# Altium footprint library Connectors THD.PcbLib: 631 footprints (part 39 of 46)
Each footprint in its own frame and in the unit in brackets; x right, y up, seen from the top. Pads: shape width x height; smd on the part's side, far side on the other; paste and mask are expansions set on the pad; w line width, h text height; cw(c..) or ccw(c..) is an arc to the next point about the centre after c.
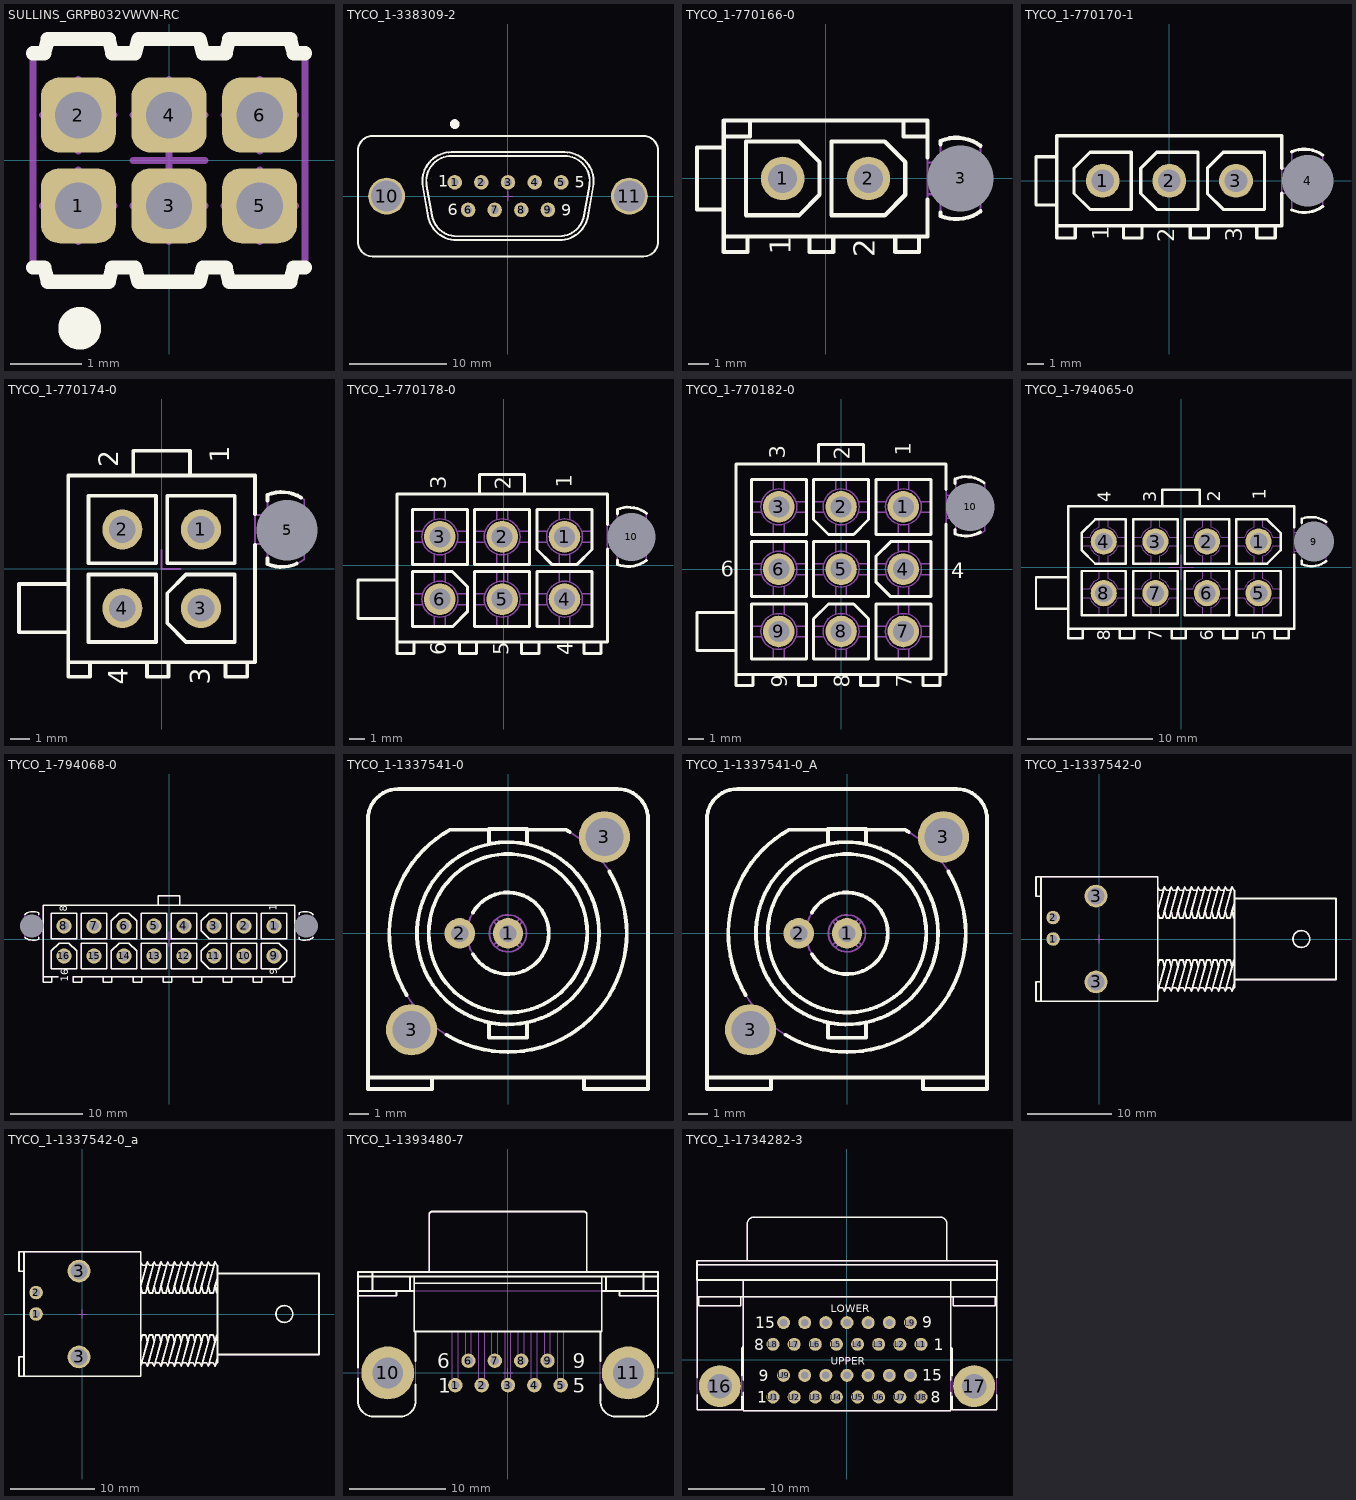
[diagram p38: the footprints below, top view; thin cyan lines are the x and y axes]

## SULLINS_GRPB032VWVN-RC [mm] "6 Contacts - Pitch 1.27mm - Dual Row Straight Strip Header - Insulator 1mm"
height 4
pads (6):
  rrect50% 1.05x1.05 hole 0.65: 1(-1.27,-0.635) 2(-1.27,0.635) 3(0,-0.635) 4(0,0.635) 5(1.27,-0.635) 6(1.27,0.635)
Top Overlay:
  circle w0.3: c-1.25,-2.35 r0.15
  lines w0.2: -1.905,-1.5 -1.746,-1.5 -1.696,-1.7 -0.844,-1.7 -0.794,-1.5 -0.476,-1.5 -0.426,-1.7 0.426,-1.7 0.476,-1.5 0.794,-1.5 0.844,-1.7 1.696,-1.7 1.746,-1.5 1.905,-1.5 ; -1.905,1.5 -1.746,1.5 -1.696,1.7 -0.844,1.7 -0.794,1.5 -0.476,1.5 -0.426,1.7 0.426,1.7 0.476,1.5 0.794,1.5 0.844,1.7 1.696,1.7 1.746,1.5 1.905,1.5
Mechanical 8:
  lines w0.1: -1.77,-0.635 -1.27,-0.635 ; -1.77,0.635 -1.27,0.635 ; -1.27,-1.135 -1.27,-0.635 ; -1.27,-0.135 -1.27,-0.635 ; -1.27,0.135 -1.27,0.635 ; -1.27,1.135 -1.27,0.635 ; -0.77,-0.635 -1.27,-0.635 ; -0.77,0.635 -1.27,0.635 ; -0.5,-0.635 0,-0.635 ; -0.5,0 0,0 ; -0.5,0.635 0,0.635 ; 0,-1.135 0,-0.635 ; 0,-0.5 0,0 ; 0,0.5 0,0 ; 0,1.135 0,0.635 ; 0.5,-0.635 0,-0.635 ; 0.5,0 0,0 ; 0.5,0.635 0,0.635 ; 0.77,-0.635 1.27,-0.635 ; 0.77,0.635 1.27,0.635 ; 1.27,-1.135 1.27,-0.635 ; 1.27,-0.135 1.27,-0.635 ; 1.27,0.135 1.27,0.635 ; 1.27,1.135 1.27,0.635 ; 1.77,-0.635 1.27,-0.635 ; 1.77,0.635 1.27,0.635
Mechanical 14:
  lines w0.1: -1.47,-0.835 -1.37,-0.735 ; -1.47,-0.835 -1.07,-0.835 ; -1.47,-0.835 -1.47,-0.435 ; -1.47,-0.435 -1.37,-0.535 ; -1.47,-0.435 -1.07,-0.435 ; -1.47,0.435 -1.37,0.535 ; -1.47,0.435 -1.07,0.435 ; -1.47,0.435 -1.47,0.835 ; -1.47,0.835 -1.37,0.735 ; -1.47,0.835 -1.07,0.835 ; -1.37,-0.735 -1.37,-0.535 ; -1.37,-0.735 -1.17,-0.735 ; -1.37,-0.535 -1.17,-0.535 ; -1.37,0.535 -1.37,0.735 ; -1.37,0.535 -1.17,0.535 ; -1.37,0.735 -1.17,0.735 ; -1.17,-0.735 -1.07,-0.835 ; -1.17,-0.735 -1.17,-0.535 ; -1.17,-0.535 -1.07,-0.435 ; -1.17,0.535 -1.07,0.435 ; -1.17,0.535 -1.17,0.735 ; -1.17,0.735 -1.07,0.835 ; -1.07,-0.835 -1.07,-0.435 ; -1.07,0.435 -1.07,0.835 ; -0.2,-0.835 -0.1,-0.735 ; -0.2,-0.835 0.2,-0.835 ; -0.2,-0.835 -0.2,-0.435 ; -0.2,-0.435 -0.1,-0.535 ; -0.2,-0.435 0.2,-0.435 ; -0.2,0.435 -0.1,0.535 ; -0.2,0.435 0.2,0.435 ; -0.2,0.435 -0.2,0.835 ; -0.2,0.835 -0.1,0.735 ; -0.2,0.835 0.2,0.835 ; -0.1,-0.735 -0.1,-0.535 ; -0.1,-0.735 0.1,-0.735 ; -0.1,-0.535 0.1,-0.535 ; -0.1,0.535 -0.1,0.735 ; -0.1,0.535 0.1,0.535 ; -0.1,0.735 0.1,0.735 ; 0.1,-0.735 0.2,-0.835 ; 0.1,-0.735 0.1,-0.535 ; 0.1,-0.535 0.2,-0.435 ; 0.1,0.535 0.2,0.435 ; 0.1,0.535 0.1,0.735 ; 0.1,0.735 0.2,0.835 ; 0.2,-0.835 0.2,-0.435 ; 0.2,0.435 0.2,0.835 ; 1.07,-0.835 1.17,-0.735 ; 1.07,-0.835 1.47,-0.835 ; 1.07,-0.835 1.07,-0.435 ; 1.07,-0.435 1.17,-0.535 ; 1.07,-0.435 1.47,-0.435 ; 1.07,0.435 1.17,0.535 ; 1.07,0.435 1.47,0.435 ; 1.07,0.435 1.07,0.835 ; 1.07,0.835 1.17,0.735 ; 1.07,0.835 1.47,0.835 ; 1.17,-0.735 1.17,-0.535 ; 1.17,-0.735 1.37,-0.735 ; 1.17,-0.535 1.37,-0.535 ; 1.17,0.535 1.17,0.735 ; 1.17,0.535 1.37,0.535 ; 1.17,0.735 1.37,0.735 ; 1.37,-0.735 1.47,-0.835 ; 1.37,-0.735 1.37,-0.535 ; 1.37,-0.535 1.47,-0.435 ; 1.37,0.535 1.47,0.435 ; 1.37,0.535 1.37,0.735 ; 1.37,0.735 1.47,0.835 ; 1.47,-0.835 1.47,-0.435 ; 1.47,0.435 1.47,0.835 ; -1.905,-1.5 -1.905,1.5 -1.746,1.5 -1.696,1.7 -0.844,1.7 -0.794,1.5 -0.476,1.5 -0.426,1.7 0.426,1.7 0.476,1.5 0.794,1.5 0.844,1.7 1.696,1.7 1.746,1.5 1.905,1.5 1.905,-1.5 1.746,-1.5 1.696,-1.7 0.844,-1.7 0.794,-1.5 0.476,-1.5 0.426,-1.7 -0.426,-1.7 -0.476,-1.5 -0.794,-1.5 -0.844,-1.7 -1.696,-1.7 -1.746,-1.5 -1.905,-1.5
3D body: height 4, standoff -2.3, extent -1.905,-1.7 1.905,1.7

## TYCO_1-338309-2 [mm] "Straight D-SUB 9 Male Contacts Connector with Harpoons and Female Screwlock (UNC4-40)"
height 11.7
pads (11):
  round 1.5 hole 0.8: 1(-5.486,1.423) 2(-2.743,1.423) 3(0,1.423) 4(2.743,1.423) 5(5.486,1.423) 6(-4.114,-1.423) 7(-1.371,-1.423) 8(1.372,-1.423) 9(4.115,-1.423)
  round 3.8 hole 3.2: 10(-12.495,0) 11(12.495,0)
Top Overlay:
  circle w0.5: c-5.48,7.42 r0.25
  lines w0.2: -15.445,-4.7 ccw(c-13.945,-4.7) -13.945,-6.2 13.945,-6.2 ccw(c13.945,-4.7) 15.445,-4.7 15.445,4.7 ccw(c13.945,4.7) 13.945,6.2 -13.945,6.2 ccw(c-13.945,4.7) -15.445,4.7 -15.445,-4.7 ; -8.775,1.021 cw(c-5.83,1.54) -5.83,4.53 5.83,4.53 cw(c5.83,1.54) 8.775,1.021 8.232,-2.059 cw(c5.287,-1.54) 5.287,-4.53 -5.287,-4.53 cw(c-5.287,-1.54) -8.231,-2.059 -8.775,1.021 ; -8.381,1.09 cw(c-5.83,1.54) -5.83,4.13 5.83,4.13 cw(c5.83,1.54) 8.381,1.09 7.838,-1.99 cw(c5.287,-1.54) 5.287,-4.13 -5.287,-4.13 cw(c-5.287,-1.54) -7.838,-1.99 -8.381,1.09
  text "6" at -6.21,-1.97 h1.2
  text "5" at 6.855,0.87 h1.2
  text "1" at -7.18,0.945 h1.2
  text "9" at 5.485,-2.02 h1.2
Mechanical 8:
  lines w0.1: -12.995,0 -12.495,0 ; -12.495,-0.5 -12.495,0 ; -12.495,0.5 -12.495,0 ; -11.995,0 -12.495,0 ; -5.986,1.423 -5.486,1.423 ; -5.486,0.923 -5.486,1.423 ; -5.486,1.923 -5.486,1.423 ; -4.986,1.423 -5.486,1.423 ; -4.614,-1.423 -4.114,-1.423 ; -4.114,-1.923 -4.114,-1.423 ; -4.114,-0.923 -4.114,-1.423 ; -3.614,-1.423 -4.114,-1.423 ; -3.243,1.423 -2.743,1.423 ; -2.743,0.923 -2.743,1.423 ; -2.743,1.923 -2.743,1.423 ; -2.243,1.423 -2.743,1.423 ; -1.871,-1.423 -1.371,-1.423 ; -1.371,-1.923 -1.371,-1.423 ; -1.371,-0.923 -1.371,-1.423 ; -0.871,-1.423 -1.371,-1.423 ; -0.5,0 0,0 ; -0.5,1.423 0,1.423 ; 0,-0.5 0,0 ; 0,0.5 0,0 ; 0,0.923 0,1.423 ; 0,1.923 0,1.423 ; 0.5,0 0,0 ; 0.5,1.423 0,1.423 ; 0.872,-1.423 1.372,-1.423 ; 1.372,-1.923 1.372,-1.423 ; 1.372,-0.923 1.372,-1.423 ; 1.872,-1.423 1.372,-1.423 ; 2.243,1.423 2.743,1.423 ; 2.743,0.923 2.743,1.423 ; 2.743,1.923 2.743,1.423 ; 3.243,1.423 2.743,1.423 ; 3.615,-1.423 4.115,-1.423 ; 4.115,-1.923 4.115,-1.423 ; 4.115,-0.923 4.115,-1.423 ; 4.615,-1.423 4.115,-1.423 ; 4.986,1.423 5.486,1.423 ; 5.486,0.923 5.486,1.423 ; 5.486,1.923 5.486,1.423 ; 5.986,1.423 5.486,1.423 ; 11.995,0 12.495,0 ; 12.495,-0.5 12.495,0 ; 12.495,0.5 12.495,0 ; 12.995,0 12.495,0
Mechanical 14:
  circle w0.1: c-4.114,-1.423 r0.51
  circle w0.1: c-1.371,-1.423 r0.51
  circle w0.1: c1.372,-1.423 r0.51
  circle w0.1: c4.115,-1.423 r0.51
  circle w0.1: c5.486,1.423 r0.51
  circle w0.1: c2.743,1.423 r0.51
  circle w0.1: c0,1.423 r0.51
  circle w0.1: c-2.743,1.423 r0.51
  circle w0.1: c-5.486,1.423 r0.51
  circle w0.1: c12.495,0 r1.422
  circle w0.1: c-12.495,0 r1.422
  lines w0.1: -15.445,-4.7 ccw(c-13.945,-4.7) -13.945,-6.2 13.945,-6.2 ccw(c13.945,-4.7) 15.445,-4.7 15.445,4.7 ccw(c13.945,4.7) 13.945,6.2 -13.945,6.2 ccw(c-13.945,4.7) -15.445,4.7 -15.445,-4.7 ; -8.775,1.021 cw(c-5.83,1.54) -5.83,4.53 5.83,4.53 cw(c5.83,1.54) 8.775,1.021 8.232,-2.059 cw(c5.287,-1.54) 5.287,-4.53 -5.287,-4.53 cw(c-5.287,-1.54) -8.231,-2.059 -8.775,1.021 ; -8.381,1.09 cw(c-5.83,1.54) -5.83,4.13 5.83,4.13 cw(c5.83,1.54) 8.381,1.09 7.838,-1.99 cw(c5.287,-1.54) 5.287,-4.13 -5.287,-4.13 cw(c-5.287,-1.54) -7.838,-1.99 -8.381,1.09
  text "9" at 5.485,-2.02 h1.2
  text "1" at -7.18,0.945 h1.2
  text "5" at 6.855,0.87 h1.2
  text "6" at -6.21,-1.97 h1.2
  text "9 D-Sub Male" at -6.053,4.872 h1.2
3D body: height 11.95, standoff -3.2, extent -15.445,-6.2 15.445,6.2

## TYCO_1-770166-0 [mm] "2 Circuits In-Line - Mini-Universal MATE-N-LOK Connector"
height 14.25
pads (3):
  round 2.1 hole 1.4: 1(-2.07,0) 2(2.07,0)
  round 1 hole 3.2 unplated mask+1.2: 3(6.52,0)
Top Overlay:
  lines w0.2: -4.915,-1.499 -6.21,-1.499 -6.21,1.499 -4.915,1.499 ; -4.915,2.032 -3.645,2.032 -3.645,2.794 ; -3.772,-2.794 -3.772,-3.556 -4.915,-3.556 -4.915,-2.794 ; -0.775,-2.794 -0.775,-3.556 0.368,-3.556 0.368,-2.794 ; 3.366,-2.794 3.366,-3.556 4.509,-3.556 4.509,-2.794 ; 3.772,2.794 3.772,2.032 4.915,2.032 ; 4.915,-1.016 4.915,-2.794 -4.915,-2.794 ; 4.915,1.016 4.915,2.794 -4.915,2.794 -4.915,-2.794 ; 5.55,-1.651 5.55,-1.815 ccw(c6.312,0) 7.48,-1.584 ; 5.55,1.651 5.55,1.815 cw(c6.312,0) 7.48,1.584 ; -3.848,-1.778 -3.848,1.778 -1.283,1.778 -0.292,0.787 -0.292,-0.787 -1.283,-1.778 -3.848,-1.778 ; 0.292,-1.778 0.292,1.778 2.858,1.778 3.848,0.787 3.848,-0.787 2.858,-1.778 0.292,-1.778
  text "1" at -1.689,-3.683 h1.02
  text "2" at 2.375,-3.81 h1.02
Mechanical 14:
  lines w0.1: -4.915,-1.499 -6.21,-1.499 -6.21,1.499 -4.915,1.499 ; -4.915,2.032 -3.645,2.032 -3.645,2.794 ; -3.772,-2.794 -3.772,-3.556 -4.915,-3.556 -4.915,-2.794 ; -0.775,-2.794 -0.775,-3.556 0.368,-3.556 0.368,-2.794 ; 3.366,-2.794 3.366,-3.556 4.509,-3.556 4.509,-2.794 ; 3.772,2.794 3.772,2.032 4.915,2.032 ; 4.915,-0.762 5.55,-0.762 5.55,-1.815 ccw(c6.312,0) 7.48,-1.584 7.48,1.584 ccw(c6.312,0) 5.55,1.815 5.55,0.762 4.915,0.762 ; -4.915,-2.794 -4.915,2.794 4.915,2.794 4.915,-2.794 -4.915,-2.794 ; -3.848,-1.778 -3.848,1.778 -1.283,1.778 -0.292,0.787 -0.292,-0.787 -1.283,-1.778 -3.848,-1.778 ; 0.292,-1.778 0.292,1.778 2.858,1.778 3.848,0.787 3.848,-0.787 2.858,-1.778 0.292,-1.778
  text "1" at -1.689,-3.683 h1.02
  text "2" at 2.375,-3.81 h1.02
3D body: height 14.25, standoff -4.32, extent -6.21,-3.556 7.481,2.794

## TYCO_1-770170-1 [mm] "3 Circuits In-Line - Mini-Universal MATE-N-LOK Connector"
height 14.25
pads (4):
  round 2.1 hole 1.4: 1(-4.14,0) 2(0,0) 3(4.14,0)
  round 1 hole 3.2 unplated mask+1.2: 4(8.59,0)
Top Overlay:
  lines w0.2: -6.985,-2.794 6.985,-2.794 6.985,-0.773 ; -6.985,-1.499 -8.28,-1.499 -8.28,1.499 -6.985,1.499 ; -5.842,-2.794 -5.842,-3.556 -6.985,-3.556 -6.985,2.794 6.985,2.794 6.985,0.773 ; -2.845,-2.794 -2.845,-3.556 -1.702,-3.556 -1.702,-2.794 ; 1.295,-2.794 1.295,-3.556 2.438,-3.556 2.438,-2.794 ; 5.436,-2.794 5.436,-3.556 6.579,-3.556 6.579,-2.794 ; 7.595,-1.804 ccw(c8.382,0) 9.525,-1.603 ; 7.595,1.804 cw(c8.382,0) 9.525,1.603 ; -5.918,-0.787 -5.918,0.787 -4.928,1.778 -2.362,1.778 -2.362,-1.778 -4.928,-1.778 -5.918,-0.787 ; -1.778,-0.787 -1.778,0.787 -0.787,1.778 1.778,1.778 1.778,-1.778 -0.787,-1.778 -1.778,-0.787 ; 2.362,-0.787 3.353,-1.778 5.918,-1.778 5.918,1.778 3.353,1.778 2.362,0.787 2.362,-0.787
  text "3" at 4.521,-3.783 h1.02
  text "1" at -3.759,-3.683 h1.02
  text "2" at 0.305,-3.81 h1.02
Mechanical 8:
  lines w0.1: -4.64,0 -4.14,0 ; -4.14,-0.5 -4.14,0 ; -4.14,0.5 -4.14,0 ; -3.64,0 -4.14,0 ; -0.5,0 0,0 ; 0,-0.5 0,0 ; 0,0.5 0,0 ; 0.5,0 0,0 ; 3.64,0 4.14,0 ; 4.14,-0.5 4.14,0 ; 4.14,0.5 4.14,0 ; 4.64,0 4.14,0 ; 8.09,0 8.59,0 ; 8.59,-0.5 8.59,0 ; 8.59,0.5 8.59,0 ; 9.09,0 8.59,0
Mechanical 14:
  circle w0.1: c4.14,0 r0.5
  circle w0.1: c0,0 r0.5
  circle w0.1: c-4.14,0 r0.5
  lines w0.1: -6.985,-2.794 6.985,-2.794 6.985,2.794 -6.985,2.794 -6.985,-3.556 -5.842,-3.556 -5.842,-2.794 ; -6.985,-1.499 -8.28,-1.499 -8.28,1.499 -6.985,1.499 ; -2.845,-2.794 -2.845,-3.556 -1.702,-3.556 -1.702,-2.794 ; 1.295,-2.794 1.295,-3.556 2.438,-3.556 2.438,-2.794 ; 5.436,-2.794 5.436,-3.556 6.579,-3.556 6.579,-2.794 ; 6.985,-0.762 7.595,-0.762 ; 6.985,0.762 7.595,0.762 ; 7.62,-0.795 7.62,0.795 ; 9.525,-0.881 cw(c8.611,0) 7.595,-0.762 ; 9.525,0.881 ccw(c8.611,0) 7.595,0.762 ; 7.595,-0.762 7.595,-1.804 ccw(c8.382,0) 9.525,-1.603 9.525,1.603 ccw(c8.382,0) 7.595,1.804 7.595,0.762 ; -5.918,-0.787 -5.918,0.787 -4.928,1.778 -2.362,1.778 -2.362,-1.778 -4.928,-1.778 -5.918,-0.787 ; -1.778,-0.787 -1.778,0.787 -0.787,1.778 1.778,1.778 1.778,-1.778 -0.787,-1.778 -1.778,-0.787 ; 2.362,-0.787 3.353,-1.778 5.918,-1.778 5.918,1.778 3.353,1.778 2.362,0.787 2.362,-0.787
  text "3" at 4.521,-3.783 h1.02
  text "1" at -3.759,-3.683 h1.02
  text "2" at 0.305,-3.81 h1.02
3D body: height 14.25, standoff -4.32, extent -8.28,-3.556 9.525,2.794

## TYCO_1-770174-0 [mm] "4 Circuits Dual-Row - Mini-Universal MATE-N-LOK Connector"
height 14.25
pads (5):
  round 2.1 hole 1.4: 1(2.07,2.07) 2(-2.07,2.07) 3(2.07,-2.07) 4(-2.07,-2.07)
  round 1 hole 3.2 unplated mask+1.2: 5(6.604,2.032)
Top Overlay:
  lines w0.2: -4.915,-3.34 -7.506,-3.34 -7.506,-0.8 -4.915,-0.8 ; -3.772,-4.915 -3.772,-5.677 -4.915,-5.677 -4.915,-4.915 ; -1.499,4.915 -1.499,6.21 1.499,6.21 1.499,4.915 ; -0.775,-4.915 -0.775,-5.677 0.368,-5.677 0.368,-4.915 ; 3.366,-4.915 3.366,-5.677 4.509,-5.677 4.509,-4.915 ; 4.915,1.256 4.915,-4.915 -4.915,-4.915 ; 4.915,2.885 4.915,4.915 -4.915,4.915 -4.915,-4.915 ; 5.575,0.538 5.575,0.245 ccw(c6.312,2.07) 7.115,0.273 ; 5.575,3.602 5.575,3.896 cw(c6.312,2.07) 7.347,3.745 ; -3.848,-3.848 -3.848,-0.292 -0.292,-0.292 -0.292,-3.848 -3.848,-3.848 ; -3.848,0.292 -0.292,0.292 -0.292,3.848 -3.848,3.848 -3.848,0.292 ; 0.292,-2.858 0.292,-1.283 1.283,-0.292 3.848,-0.292 3.848,-3.848 1.283,-3.848 0.292,-2.858 ; 0.292,0.292 3.848,0.292 3.848,3.848 0.292,3.848 0.292,0.292
  text "1" at 3.556,5.588 h1.02
  text "2" at -2.286,5.334 h1.02
  text "4" at -1.778,-6.096 h1.02
  text "3" at 2.54,-6.096 h1.02
Mechanical 8:
  lines w0.1: 0,1 0,0 1,0
Mechanical 14:
  lines w0.1: -4.915,-3.34 -7.506,-3.34 -7.506,-0.8 -4.915,-0.8 ; -3.772,-4.915 -3.772,-5.677 -4.915,-5.677 -4.915,-4.915 ; -1.499,4.915 -1.499,6.21 1.499,6.21 1.499,4.915 ; -0.775,-4.915 -0.775,-5.677 0.368,-5.677 0.368,-4.915 ; 3.366,-4.915 3.366,-5.677 4.509,-5.677 4.509,-4.915 ; 4.915,1.308 5.575,1.308 5.575,0.245 ccw(c6.312,2.07) 7.506,0.505 7.506,3.635 ccw(c6.312,2.07) 5.575,3.896 5.575,2.832 4.915,2.832 ; 5.575,1.245 ccw(c6.541,2.07) 7.506,1.245 ; 5.575,2.896 cw(c6.541,2.07) 7.506,2.896 ; -4.915,-4.915 -4.915,4.915 4.915,4.915 4.915,-4.915 -4.915,-4.915 ; -3.848,-3.848 -3.848,-0.292 -0.292,-0.292 -0.292,-3.848 -3.848,-3.848 ; -3.848,0.292 -0.292,0.292 -0.292,3.848 -3.848,3.848 -3.848,0.292 ; 0.292,-2.858 0.292,-1.283 1.283,-0.292 3.848,-0.292 3.848,-3.848 1.283,-3.848 0.292,-2.858 ; 0.292,0.292 3.848,0.292 3.848,3.848 0.292,3.848 0.292,0.292
  text "1" at 3.556,5.588 h1.02
  text "2" at -2.286,5.334 h1.02
  text "4" at -1.778,-6.096 h1.02
  text "3" at 2.54,-6.096 h1.02
3D body: height 14.25, standoff -4.32, extent -7.506,-5.677 7.506,6.21

## TYCO_1-770178-0 [mm] "6 Circuits Vertiacal Mini-Universal MATE-N-LOK Connector"
height 14.25
pads (7):
  round 2.1 hole 1.4: 1(4.023,1.894) 2(-0.117,1.894) 3(-4.257,1.894) 4(4.023,-2.246) 5(-0.117,-2.246) 6(-4.257,-2.246)
  round 1 hole 3.2 unplated mask+1.2: 10(8.473,1.894)
Top Overlay:
  lines w0.2: -7.102,-3.516 -9.693,-3.516 -9.693,-0.976 -7.102,-0.976 ; -5.959,-5.091 -5.959,-5.853 -7.102,-5.853 -7.102,-5.091 ; -2.962,-5.091 -2.962,-5.853 -1.819,-5.853 -1.819,-5.091 ; -1.616,4.739 -1.616,6.035 1.381,6.035 1.381,4.739 ; 1.178,-5.091 1.178,-5.853 2.321,-5.853 2.321,-5.091 ; 5.318,-5.091 5.318,-5.853 6.461,-5.853 6.461,-5.091 ; 6.868,1.08 6.868,-5.091 -7.102,-5.091 ; 6.868,2.701 6.868,4.731 ; 6.868,4.739 -7.102,4.739 -7.102,-5.091 ; 7.528,0.362 7.528,0.069 ccw(c8.265,1.894) 9.459,0.329 ; 7.528,3.426 7.528,3.72 cw(c8.265,1.894) 9.459,3.46 ; -6.086,-4.075 -6.086,-0.417 -3.417,-0.417 -2.429,-1.405 -2.429,-3.087 -3.417,-4.075 -6.086,-4.075 ; -6.086,0.066 -6.086,3.723 -2.429,3.723 -2.429,0.066 -6.086,0.066 ; -1.946,-4.075 -1.946,-0.417 1.712,-0.417 1.712,-4.075 -1.946,-4.075 ; -1.946,0.066 -1.946,3.723 1.712,3.723 1.712,0.066 -1.946,0.066 ; 2.194,-4.075 2.194,-0.417 5.852,-0.417 5.852,-4.075 2.194,-4.075 ; 2.194,1.053 3.182,0.066 4.864,0.066 5.852,1.053 5.852,3.723 2.194,3.723 2.194,1.053
  text "2" at 0.459,5.015 h1.02
  text "6" at -3.829,-5.977 h1.02
  text "5" at 0.311,-5.977 h1.02
  text "4" at 4.578,-5.977 h1.02
  text "3" at -3.842,5.069 h1.02
  text "1" at 4.513,5.142 h1.02
Mechanical 8:
  lines w0.1: -5.257,-2.246 -4.257,-2.246 ; -5.257,1.894 -4.257,1.894 ; -4.257,-3.246 -4.257,-2.246 ; -4.257,-1.246 -4.257,-2.246 ; -4.257,0.894 -4.257,1.894 ; -4.257,2.894 -4.257,1.894 ; -3.257,-2.246 -4.257,-2.246 ; -3.257,1.894 -4.257,1.894 ; -1.117,-2.246 -0.117,-2.246 ; -1.117,1.894 -0.117,1.894 ; -1,0 0,0 ; -0.117,-3.246 -0.117,-2.246 ; -0.117,-1.246 -0.117,-2.246 ; -0.117,0.894 -0.117,1.894 ; -0.117,2.894 -0.117,1.894 ; 0,-1 0,0 ; 0,1 0,0 ; 0.883,-2.246 -0.117,-2.246 ; 0.883,1.894 -0.117,1.894 ; 1,0 0,0 ; 3.023,-2.246 4.023,-2.246 ; 3.023,1.894 4.023,1.894 ; 4.023,-3.246 4.023,-2.246 ; 4.023,-1.246 4.023,-2.246 ; 4.023,0.894 4.023,1.894 ; 4.023,2.894 4.023,1.894 ; 5.023,-2.246 4.023,-2.246 ; 5.023,1.894 4.023,1.894 ; 7.473,1.894 8.473,1.894 ; 8.473,0.894 8.473,1.894 ; 8.473,2.894 8.473,1.894 ; 9.473,1.894 8.473,1.894
Mechanical 14:
  circle w0.1: c-4.257,-2.246 r0.5
  circle w0.1: c-4.257,-2.246 r1.194
  circle w0.1: c4.023,1.894 r0.5
  circle w0.1: c4.023,1.894 r1.194
  circle w0.1: c-4.257,1.894 r0.5
  circle w0.1: c-4.257,1.894 r1.194
  circle w0.1: c-0.117,1.894 r0.5
  circle w0.1: c-0.117,1.894 r1.194
  circle w0.1: c-0.117,-2.246 r0.5
  circle w0.1: c-0.117,-2.246 r1.194
  circle w0.1: c4.023,-2.246 r0.5
  circle w0.1: c4.023,-2.246 r1.194
  lines w0.1: -7.102,-3.516 -9.693,-3.516 -9.693,-0.976 -7.102,-0.976 ; -6.086,-2.601 -5.397,-2.601 ; -6.086,-1.89 -5.397,-1.89 ; -6.086,1.539 -5.397,1.539 ; -6.086,2.25 -5.397,2.25 ; -5.959,-5.091 -5.959,-5.853 -7.102,-5.853 -7.102,-5.091 ; -4.613,-4.075 -4.613,-3.385 ; -4.613,-1.106 -4.613,-0.417 ; -4.613,0.066 -4.613,0.755 ; -4.613,3.034 -4.613,3.723 ; -3.902,-4.075 -3.902,-3.385 ; -3.902,-1.106 -3.902,-0.417 ; -3.902,0.066 -3.902,0.755 ; -3.902,3.034 -3.902,3.723 ; -3.118,-2.601 -2.429,-2.601 ; -3.118,-1.89 -2.429,-1.89 ; -3.118,1.539 -2.429,1.539 ; -3.118,2.25 -2.429,2.25 ; -2.962,-5.091 -2.962,-5.853 -1.819,-5.853 -1.819,-5.091 ; -1.946,-2.601 -1.257,-2.601 ; -1.946,-1.89 -1.257,-1.89 ; -1.946,1.539 -1.257,1.539 ; -1.946,2.25 -1.257,2.25 ; -1.616,4.739 -1.616,6.035 1.381,6.035 1.381,4.739 ; -0.473,-4.075 -0.473,-3.385 ; -0.473,-1.106 -0.473,-0.417 ; -0.473,0.066 -0.473,0.755 ; -0.473,3.034 -0.473,3.723 ; 0.238,-4.075 0.238,-3.385 ; 0.238,-1.106 0.238,-0.417 ; 0.238,0.066 0.238,0.755 ; 0.238,3.034 0.238,3.723 ; 1.022,-2.601 1.712,-2.601 ; 1.022,-1.89 1.712,-1.89 ; 1.022,1.539 1.712,1.539 ; 1.022,2.25 1.712,2.25 ; 1.178,-5.091 1.178,-5.853 2.321,-5.853 2.321,-5.091 ; 2.194,-2.601 2.883,-2.601 ; 2.194,-1.89 2.883,-1.89 ; 2.194,1.539 2.883,1.539 ; 2.194,2.25 2.883,2.25 ; 3.667,-4.075 3.667,-3.385 ; 3.667,-1.106 3.667,-0.417 ; 3.667,0.066 3.667,0.755 ; 3.667,3.034 3.667,3.723 ; 4.379,-4.075 4.379,-3.385 ; 4.379,-1.106 4.379,-0.417 ; 4.379,0.066 4.379,0.755 ; 4.379,3.034 4.379,3.723 ; 5.163,-2.601 5.852,-2.601 ; 5.163,-1.89 5.852,-1.89 ; 5.163,1.539 5.852,1.539 ; 5.163,2.25 5.852,2.25 ; 5.318,-5.091 5.318,-5.853 6.461,-5.853 6.461,-5.091 ; 6.868,1.132 7.528,1.132 ; 6.868,2.656 7.528,2.656 ; 7.528,1.069 ccw(c8.493,1.894) 9.459,1.069 ; 7.528,2.72 cw(c8.493,1.894) 9.459,2.72 ; -7.102,-5.091 -7.102,4.739 6.868,4.739 6.868,-5.091 -7.102,-5.091 ; -6.086,-4.075 -6.086,-0.417 -3.417,-0.417 -2.429,-1.405 -2.429,-3.087 -3.417,-4.075 -6.086,-4.075 ; -6.086,0.066 -6.086,3.723 -2.429,3.723 -2.429,0.066 -6.086,0.066 ; -1.946,-4.075 -1.946,-0.417 1.712,-0.417 1.712,-4.075 -1.946,-4.075 ; -1.946,0.066 -1.946,3.723 1.712,3.723 1.712,0.066 -1.946,0.066 ; 2.194,-4.075 2.194,-0.417 5.852,-0.417 5.852,-4.075 2.194,-4.075 ; 2.194,1.053 3.182,0.066 4.864,0.066 5.852,1.053 5.852,3.723 2.194,3.723 2.194,1.053 ; 7.528,0.069 ccw(c8.265,1.894) 9.459,0.329 9.459,3.46 ccw(c8.265,1.894) 7.528,3.72 7.528,0.069
  text "2" at 0.459,5.015 h1.02
  text "6" at -3.829,-5.977 h1.02
  text "5" at 0.311,-5.977 h1.02
  text "4" at 4.578,-5.977 h1.02
  text "3" at -3.842,5.069 h1.02
  text "1" at 4.513,5.142 h1.02
3D body: height 14.25, standoff -4.32, extent -9.693,-5.853 9.459,6.035

## TYCO_1-770182-0 [mm] "9 Circuits Vertiacal Mini-Universal MATE-N-LOK Connector"
height 14.25
pads (10):
  round 2.1 hole 1.4: 1(4.14,4.14) 2(0,4.14) 3(-4.14,4.14) 4(4.14,0) 5(0,0) 6(-4.14,0) 7(4.14,-4.14) 8(0,-4.14) 9(-4.14,-4.14)
  round 1 hole 3.2 unplated mask+1.2: 10(8.59,4.14)
Top Overlay:
  lines w0.2: -6.985,-5.41 -9.576,-5.41 -9.576,-2.87 -6.985,-2.87 ; -5.842,-6.985 -5.842,-7.747 -6.985,-7.747 -6.985,-6.985 ; -2.845,-6.985 -2.845,-7.747 -1.702,-7.747 -1.702,-6.985 ; -1.499,6.985 -1.499,8.28 1.499,8.28 1.499,6.985 ; 1.295,-6.985 1.295,-7.747 2.438,-7.747 2.438,-6.985 ; 5.436,-6.985 5.436,-7.747 6.579,-7.747 6.579,-6.985 ; 6.985,3 6.985,-6.985 -6.985,-6.985 ; 6.985,5.3 6.985,6.985 -6.985,6.985 -6.985,-6.985 ; 7.561,2.646 7.561,2.353 ccw(c8.298,4.178) 9.267,2.465 ; 7.561,5.71 7.561,6.004 cw(c8.298,4.178) 9.492,5.743 ; -5.969,-5.969 -5.969,-2.311 -2.311,-2.311 -2.311,-5.969 -5.969,-5.969 ; -5.969,-1.829 -5.969,1.829 -2.311,1.829 -2.311,-1.829 -5.969,-1.829 ; -5.969,2.311 -5.969,5.969 -2.311,5.969 -2.311,2.311 -5.969,2.311 ; -1.829,-5.969 1.829,-5.969 1.829,-3.299 0.841,-2.311 -0.841,-2.311 -1.829,-3.299 -1.829,-5.969 ; -1.829,-1.829 -1.829,1.829 1.829,1.829 1.829,-1.829 -1.829,-1.829 ; -1.829,3.299 -0.841,2.311 0.841,2.311 1.829,3.299 1.829,5.969 -1.829,5.969 -1.829,3.299 ; 2.311,-5.969 2.311,-2.311 5.969,-2.311 5.969,-5.969 2.311,-5.969 ; 2.311,-0.841 3.299,-1.829 5.969,-1.829 5.969,1.829 3.299,1.829 2.311,0.841 2.311,-0.841 ; 2.311,2.311 2.311,5.969 5.969,5.969 5.969,2.311 2.311,2.311
  text "2" at 0.576,7.261 h1.02
  text "1" at 4.64,7.555 h1.02
  text "3" at -3.715,7.355 h1.02
  text "7" at 4.705,-7.882 h1.02
  text "8" at 0.565,-7.882 h1.02
  text "9" at -3.575,-7.882 h1.02
  text "4" at 7.318,-0.605 h1.02
  text "6" at -7.982,-0.505 h1.02
Mechanical 8:
  lines w0.1: -5.14,-4.14 -4.14,-4.14 ; -5.14,0 -4.14,0 ; -5.14,4.14 -4.14,4.14 ; -4.14,-5.14 -4.14,-4.14 ; -4.14,-3.14 -4.14,-4.14 ; -4.14,-1 -4.14,0 ; -4.14,1 -4.14,0 ; -4.14,3.14 -4.14,4.14 ; -4.14,5.14 -4.14,4.14 ; -3.14,-4.14 -4.14,-4.14 ; -3.14,0 -4.14,0 ; -3.14,4.14 -4.14,4.14 ; -1,-4.14 0,-4.14 ; -1,4.14 0,4.14 ; 0,-5.14 0,-4.14 ; 0,-3.14 0,-4.14 ; 0,3.14 0,4.14 ; 0,5.14 0,4.14 ; 1,-4.14 0,-4.14 ; 1,4.14 0,4.14 ; 3.14,-4.14 4.14,-4.14 ; 3.14,0 4.14,0 ; 3.14,4.14 4.14,4.14 ; 4.14,-5.14 4.14,-4.14 ; 4.14,-3.14 4.14,-4.14 ; 4.14,-1 4.14,0 ; 4.14,1 4.14,0 ; 4.14,3.14 4.14,4.14 ; 4.14,5.14 4.14,4.14 ; 5.14,-4.14 4.14,-4.14 ; 5.14,0 4.14,0 ; 5.14,4.14 4.14,4.14 ; 7.59,4.14 8.59,4.14 ; 8.59,3.14 8.59,4.14 ; 8.59,5.14 8.59,4.14 ; 9.59,4.14 8.59,4.14 ; 0,0 -1,0 0,0 ; 0,0 1,0 0,0 ; 0,0 0,1 0,0 ; 0,0 0,-1 0,0
Mechanical 14:
  drawing of 162 lines, arcs and shapes, not listed
  text "2" at 0.576,7.261 h1.02
  text "1" at 4.64,7.555 h1.02
  text "3" at -3.715,7.355 h1.02
  text "7" at 4.705,-7.882 h1.02
  text "8" at 0.565,-7.882 h1.02
  text "9" at -3.575,-7.882 h1.02
  text "4" at 7.318,-0.605 h1.02
  text "6" at -7.982,-0.505 h1.02
3D body: height 14.25, standoff -4.32, extent -9.576,-7.747 9.576,8.28
